# Altium footprint library Components.PcbLib: 41 footprints (part 1 of 3)
Each footprint in its own frame and in the unit in brackets; x right, y up, seen from the top. Pads: shape width x height; smd on the part's side, far side on the other; paste and mask are expansions set on the pad; w line width, h text height; cw(c..) or ccw(c..) is an arc to the next point about the centre after c.
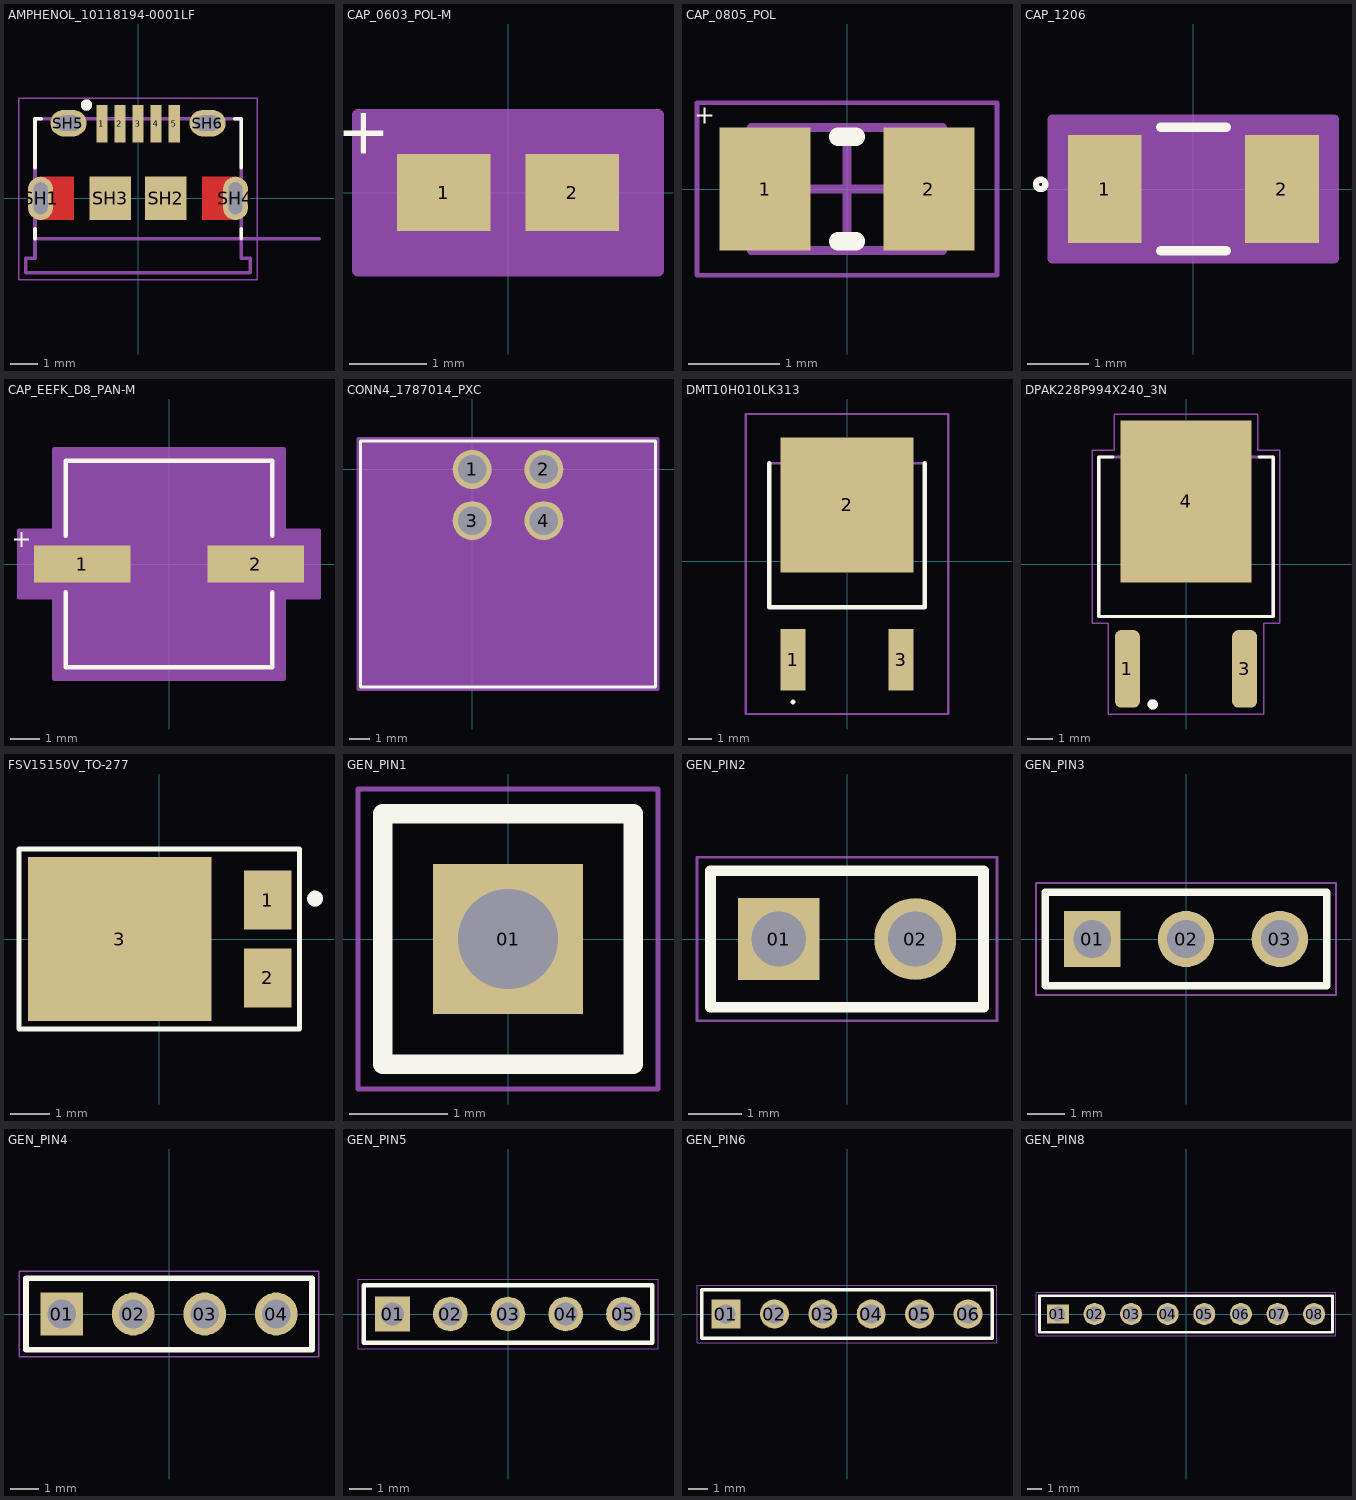
[diagram p0: the footprints below, top view; thin cyan lines are the x and y axes]

## AMPHENOL_10118194-0001LF [mm]
height 2.66
pads (11):
  rect 0.4x1.35 smd: 1(-1.3,2.675) 2(-0.65,2.675) 3(0,2.675) 4(0.65,2.675) 5(1.3,2.675)
  oval 0.9x1.55 hole 0.5 slot 1.15 at 90 deg mask+0: SH1(-3.5,0) SH4(3.5,0)
  rect 1.5x1.55 smd: SH2(1,0) SH3(-1,0)
  oval 1.3x0.95 hole 0.55 slot 0.9 at 0 deg: SH5(-2.5,2.7) SH6(2.5,2.7)
Top Layer:
  region: -2.3,-0.775 -3.445,-0.775 -3.471,-0.774 -3.497,-0.772 -3.523,-0.769 -3.549,-0.764 -3.574,-0.758 -3.6,-0.751 -3.624,-0.742 -3.648,-0.732 -3.672,-0.721 -3.695,-0.708 -3.717,-0.694 -3.739,-0.68 -3.76,-0.664 -3.78,-0.647 -3.799,-0.629 -3.817,-0.61 -3.834,-0.59 -3.85,-0.569 -3.864,-0.547 -3.878,-0.525 -3.891,-0.502 -3.902,-0.478 -3.912,-0.454 -3.921,-0.43 -3.928,-0.404 -3.934,-0.379 -3.939,-0.353 -3.942,-0.327 -3.944,-0.301 -3.945,-0.275 -3.945,0.275 -3.944,0.301 -3.942,0.327 -3.939,0.353 -3.934,0.379 -3.928,0.404 -3.921,0.43 -3.912,0.454 -3.902,0.478 -3.891,0.502 -3.878,0.525 -3.864,0.547 -3.85,0.569 -3.834,0.59 -3.817,0.61 -3.799,0.629 -3.78,0.647 -3.76,0.664 -3.739,0.68 -3.717,0.694 -3.695,0.708 -3.672,0.721 -3.648,0.732 -3.624,0.742 -3.6,0.751 -3.574,0.758 -3.549,0.764 -3.523,0.769 -3.497,0.772 -3.471,0.774 -3.445,0.775 -2.3,0.775
  region: 3.471,0.774 3.497,0.772 3.523,0.769 3.549,0.764 3.574,0.758 3.6,0.751 3.624,0.742 3.648,0.732 3.672,0.721 3.695,0.708 3.717,0.694 3.739,0.68 3.76,0.664 3.78,0.647 3.799,0.629 3.817,0.61 3.834,0.59 3.85,0.569 3.864,0.547 3.878,0.525 3.891,0.502 3.902,0.478 3.912,0.454 3.921,0.43 3.928,0.404 3.934,0.379 3.939,0.353 3.942,0.327 3.944,0.301 3.945,0.275 3.945,-0.275 3.944,-0.301 3.942,-0.327 3.939,-0.353 3.934,-0.379 3.928,-0.404 3.921,-0.43 3.912,-0.454 3.902,-0.478 3.891,-0.502 3.878,-0.525 3.864,-0.547 3.85,-0.569 3.834,-0.59 3.817,-0.61 3.799,-0.629 3.78,-0.647 3.76,-0.664 3.739,-0.68 3.717,-0.694 3.695,-0.708 3.672,-0.721 3.648,-0.732 3.624,-0.742 3.6,-0.751 3.574,-0.758 3.549,-0.764 3.523,-0.769 3.497,-0.772 3.471,-0.774 3.445,-0.775 2.3,-0.775 2.3,0.775 3.445,0.775
Top Overlay:
  circle w0.2: c-1.85,3.35 r0.1
  lines w0.127: -3.7,-1.45 -3.7,-1.1 ; -3.7,1.1 -3.7,2.85 -3.47,2.85 ; 3.47,2.85 3.7,2.85 3.7,1.1 ; 3.7,-1.45 3.7,-1.1
Top Paste:
  region: -2.3,-0.775 -3.445,-0.775 -3.471,-0.774 -3.497,-0.772 -3.523,-0.769 -3.549,-0.764 -3.574,-0.758 -3.6,-0.751 -3.624,-0.742 -3.648,-0.732 -3.672,-0.721 -3.695,-0.708 -3.717,-0.694 -3.739,-0.68 -3.76,-0.664 -3.78,-0.647 -3.799,-0.629 -3.817,-0.61 -3.834,-0.59 -3.85,-0.569 -3.864,-0.547 -3.878,-0.525 -3.891,-0.502 -3.902,-0.478 -3.912,-0.454 -3.921,-0.43 -3.928,-0.404 -3.934,-0.379 -3.939,-0.353 -3.942,-0.327 -3.944,-0.301 -3.945,-0.275 -3.945,0.275 -3.944,0.301 -3.942,0.327 -3.939,0.353 -3.934,0.379 -3.928,0.404 -3.921,0.43 -3.912,0.454 -3.902,0.478 -3.891,0.502 -3.878,0.525 -3.864,0.547 -3.85,0.569 -3.834,0.59 -3.817,0.61 -3.799,0.629 -3.78,0.647 -3.76,0.664 -3.739,0.68 -3.717,0.694 -3.695,0.708 -3.672,0.721 -3.648,0.732 -3.624,0.742 -3.6,0.751 -3.574,0.758 -3.549,0.764 -3.523,0.769 -3.497,0.772 -3.471,0.774 -3.445,0.775 -2.3,0.775
  region: 3.471,0.774 3.497,0.772 3.523,0.769 3.549,0.764 3.574,0.758 3.6,0.751 3.624,0.742 3.648,0.732 3.672,0.721 3.695,0.708 3.717,0.694 3.739,0.68 3.76,0.664 3.78,0.647 3.799,0.629 3.817,0.61 3.834,0.59 3.85,0.569 3.864,0.547 3.878,0.525 3.891,0.502 3.902,0.478 3.912,0.454 3.921,0.43 3.928,0.404 3.934,0.379 3.939,0.353 3.942,0.327 3.944,0.301 3.945,0.275 3.945,-0.275 3.944,-0.301 3.942,-0.327 3.939,-0.353 3.934,-0.379 3.928,-0.404 3.921,-0.43 3.912,-0.454 3.902,-0.478 3.891,-0.502 3.878,-0.525 3.864,-0.547 3.85,-0.569 3.834,-0.59 3.817,-0.61 3.799,-0.629 3.78,-0.647 3.76,-0.664 3.739,-0.68 3.717,-0.694 3.695,-0.708 3.672,-0.721 3.648,-0.732 3.624,-0.742 3.6,-0.751 3.574,-0.758 3.549,-0.764 3.523,-0.769 3.497,-0.772 3.471,-0.774 3.445,-0.775 2.3,-0.775 2.3,0.775 3.445,0.775
Top Solder:
  region: -2.2,-0.875 -3.445,-0.875 -3.476,-0.874 -3.508,-0.872 -3.539,-0.868 -3.57,-0.862 -3.6,-0.855 -3.63,-0.846 -3.66,-0.835 -3.689,-0.823 -3.717,-0.81 -3.745,-0.795 -3.772,-0.778 -3.798,-0.76 -3.823,-0.741 -3.846,-0.721 -3.869,-0.699 -3.891,-0.676 -3.911,-0.653 -3.93,-0.628 -3.948,-0.602 -3.965,-0.575 -3.98,-0.547 -3.993,-0.519 -4.005,-0.49 -4.016,-0.46 -4.025,-0.43 -4.032,-0.4 -4.038,-0.369 -4.042,-0.338 -4.044,-0.306 -4.045,-0.275 -4.045,0.275 -4.044,0.306 -4.042,0.338 -4.038,0.369 -4.032,0.4 -4.025,0.43 -4.016,0.46 -4.005,0.49 -3.993,0.519 -3.98,0.547 -3.965,0.575 -3.948,0.602 -3.93,0.628 -3.911,0.653 -3.891,0.676 -3.869,0.699 -3.846,0.721 -3.823,0.741 -3.798,0.76 -3.772,0.778 -3.745,0.795 -3.717,0.81 -3.689,0.823 -3.66,0.835 -3.63,0.846 -3.6,0.855 -3.57,0.862 -3.539,0.868 -3.508,0.872 -3.476,0.874 -3.445,0.875 -2.2,0.875
  region: 3.476,0.874 3.508,0.872 3.539,0.868 3.57,0.862 3.6,0.855 3.63,0.846 3.66,0.835 3.689,0.823 3.717,0.81 3.745,0.795 3.772,0.778 3.798,0.76 3.823,0.741 3.846,0.721 3.869,0.699 3.891,0.676 3.911,0.653 3.93,0.628 3.948,0.602 3.965,0.575 3.98,0.547 3.993,0.519 4.005,0.49 4.016,0.46 4.025,0.43 4.032,0.4 4.038,0.369 4.042,0.338 4.044,0.306 4.045,0.275 4.045,-0.275 4.044,-0.306 4.042,-0.338 4.038,-0.369 4.032,-0.4 4.025,-0.43 4.016,-0.46 4.005,-0.49 3.993,-0.519 3.98,-0.547 3.965,-0.575 3.948,-0.602 3.93,-0.628 3.911,-0.653 3.891,-0.676 3.869,-0.699 3.846,-0.721 3.823,-0.741 3.798,-0.76 3.772,-0.778 3.745,-0.795 3.717,-0.81 3.689,-0.823 3.66,-0.835 3.63,-0.846 3.6,-0.855 3.57,-0.862 3.539,-0.868 3.508,-0.872 3.476,-0.874 3.445,-0.875 2.2,-0.875 2.2,0.875 3.445,0.875
Bottom Solder:
  drawing of 2 lines, arcs and shapes, not listed
Mechanical 13:
  circle w0.2: c-1.85,3.35 r0.1
  lines w0.127: 6.5,-1.45 -3.7,-1.45 ; -3.7,-1.45 -3.7,-2.15 -4.025,-2.15 -4.025,-2.68 4.025,-2.68 4.025,-2.15 3.7,-2.15 3.7,2.85 -3.7,2.85 -3.7,-1.45
  text "PCB EDGE" at 4.25,-1.25 h0.81
Mechanical 15:
  lines w0.05: -4.275,-2.93 -4.275,3.6 4.275,3.6 4.275,-2.93 -4.275,-2.93
3D body "step_temp.STEP": height 2.67, standoff -0.6, extent -4.025,-2.68 4.025,2.85

## CAP_0603_POL-M [mm]
pads (2):
  rect 1.209x1.001 smd paste+0 mask+0: 1(-0.829,0) 2(0.829,0)
Top Overlay:
  text "+" at -1.525,0.5 h0.6
Mechanical 13:
  lines w0.025: -0.875,-0.475 -0.875,0.475 ; -0.875,-0.475 -0.375,-0.475 -0.375,0.475 -0.875,0.475 ; -0.875,-0.475 0.875,-0.475 ; -0.875,-0.475 -0.875,0.475 ; -0.875,0.475 0.875,0.475 ; 0.875,-0.475 0.375,-0.475 0.375,0.475 0.875,0.475 ; 0.875,-0.475 0.875,0.475 ; 0.875,-0.475 0.875,0.475
Mechanical 15:
  region: 1.942,-1.008 -1.942,-1.008 -1.942,1.008 1.942,1.008
  lines w0.152: -1.942,-1.008 -1.942,1.008 1.942,1.008 1.942,-1.008 -1.942,-1.008
3D body "CAPC17595_87N_KEM.step": height 0.87, standoff 0, extent -0.875,-0.475 0.875,0.475

## CAP_0805_POL [mm] "Chip Resistor, 2-Leads, Body 2.00x1.25mm, IPC Medium Density"
height 0.6
pads (2):
  rect 1x1.35 smd: 1(-0.9,0) 2(0.9,0)
Top Overlay:
  lines w0.2: -0.1,-0.575 0.1,-0.575 ; -0.1,0.575 0.1,0.575
  text "+" at -1.45,0.717 h0.2
Top Courtyard:
  lines w0.05: -1.65,-0.95 1.65,-0.95 1.65,0.95 -1.65,0.95 -1.65,-0.95
  lines w0.1: -0.5,0 0.5,0 ; 0,-0.5 0,0.5
Top Assembly:
  lines w0.1: -1.05,-0.675 1.05,-0.675 1.05,0.675 -1.05,0.675 -1.05,-0.675
3D body: height 0.6, standoff 0, extent 0.7,-0.675 1.05,0.675
3D body: height 0.6, standoff 0, extent -1.05,-0.675 -0.7,0.675
3D body: height 0.6, standoff 0, extent -0.7,-0.675 0.7,0.675

## CAP_1206 [mil]
pads (2):
  rect 47x69 smd paste+0 mask+0: 1(-56.5,0) 2(56.5,0)
Top Overlay:
  circle w3.94: c-97.44,2.95 r3
  lines w6: -20.89,-39.5 20.89,-39.5 ; -20.89,39.5 20.89,39.5
Mechanical 13:
  circle w0: c-51.5,0 r3
  lines w1: -66,-34.5 -66,34.5 ; -66,-34.5 -33,-34.5 -33,34.5 -66,34.5 ; -66,-34.5 66,-34.5 ; -66,-34.5 -66,34.5 ; -66,34.5 66,34.5 ; 66,-34.5 33,-34.5 33,34.5 66,34.5 ; 66,-34.5 66,34.5 ; 66,-34.5 66,34.5
Mechanical 15:
  region: 90,-44.5 -90,-44.5 -90,44.5 90,44.5
  lines w6: -90,-44.5 -90,44.5 90,44.5 90,-44.5 -90,-44.5
3D body "CAP_UMK316AB7475KL-T_TAY.step": height 70.98, standoff 0, extent -65.98,-34.49 65.98,34.49

## CAP_EEFK_D8_PAN-M [mil]
pads (2):
  rect 130x50 smd paste+0 mask+0: 1(-116.5,0) 2(116.5,0)
Top Overlay:
  lines w6: -139,-38.1 -139,-139 139,-139 139,-38.1 ; -139,38.1 -139,139 139,139 139,38.1
  text "+" at -184.06,22.64 h23.62
Mechanical 13:
  lines w1: -134,-67 -67,-134 ; -134,67 -67,134 ; -134,-134 -134,134 134,134 134,-134 -134,-134
Mechanical 15:
  region: -154,-45 -201.5,-45 -201.5,45 -154,45 -154,154 154,154 154,45 201.5,45 201.5,-45 154,-45 154,-154 -154,-154
  lines w6: -201.5,-45 -154,-45 -154,-154 154,-154 154,-45 201.5,-45 201.5,45 154,45 154,154 -154,154 -154,45 -201.5,45 -201.5,-45
3D body "CAP_EEFK_D8_PAN.step": height 317.09, standoff 0, extent -153.5,-134.02 153.5,134.02

## CONN4_1787014_PXC [mm]
pads (4):
  round 1.905 / inner round 1.524 / far side round 1.905 hole 1.397 paste-2539.97 mask+0: 1(0,0) 2(3.5,0) 3(0,-2.5) 4(3.5,-2.5)
Top Overlay:
  lines w0.152: -5.451,-10.627 8.951,-10.627 8.951,1.387 -5.451,1.387 -5.451,-10.627
Mechanical 13:
  lines w0.025: -5.324,-10.5 8.824,-10.5 8.824,1.26 -5.324,1.26 -5.324,-10.5
Mechanical 15:
  region: 9.078,1.514 -5.578,1.514 -5.578,-10.754 9.078,-10.754
  lines w0.152: -5.578,-10.754 -5.578,1.514 9.078,1.514 9.078,-10.754 -5.578,-10.754
3D body "1787014.step": height 10.8, standoff -2, extent -5.25,-10.5 8.75,1.1

## DMT10H010LK313 [mm]
pads (3):
  rect 1.06x2.6 smd: 1(-2.286,-4.16) 3(2.286,-4.16)
  rect 5.632x5.7 smd: 2(0,2.39)
Top Overlay:
  lines w0.1: -2.286,-6 ccw(c-2.286,-5.95) -2.286,-5.9 ccw(c-2.286,-5.95) -2.286,-6
  lines w0.2: -3.29,4.16 -3.29,-1.94 3.29,-1.94 3.29,4.16
Mechanical 15:
  lines w0.1: -3.29,-1.94 3.29,-1.94 3.29,4.16 -3.29,4.16 -3.29,-1.94
Bottom Assembly:
  lines w0.1: -4.29,-6.46 4.29,-6.46 4.29,6.24 -4.29,6.24 -4.29,-6.46
3D body "DMT10H010LK3-13.stp": height 2.29, standoff -0.09, extent -3.29,-4.946 3.291,4.975

## DPAK228P994X240_3N [mm]
pads (3):
  rrect50% 0.97x3.02 smd: 1(-2.286,-4.09) 3(2.286,-4.09)
  rect 5.09x6.32 smd paste-4: 4(0,2.44)
Top Overlay:
  circle w0.2: c-1.3,-5.475 r0.1
  lines w0.127: -2.846,4.176 -3.4,4.176 -3.4,-2.044 3.4,-2.044 3.4,4.176 2.846,4.176
Top Paste:
  region: -0.41,-0.45 -2.13,-0.45 -2.13,1.11 -0.41,1.11
  region: 2.13,-0.45 0.41,-0.45 0.41,1.11 2.13,1.11
  region: -0.41,3.77 -2.13,3.77 -2.13,5.33 -0.41,5.33
  region: 2.13,3.77 0.41,3.77 0.41,5.33 2.13,5.33
  region: -0.41,1.66 -2.13,1.66 -2.13,3.22 -0.41,3.22
  region: 2.13,1.66 0.41,1.66 0.41,3.22 2.13,3.22
Mechanical 13:
  circle w0.2: c-1.3,-5.475 r0.1
  lines w0.127: -3.4,-2.044 -3.4,4.176 3.4,4.176 3.4,-2.044 -3.4,-2.044
Mechanical 15:
  lines w0.05: -3.65,-2.32 -3.65,4.43 -2.8,4.43 -2.8,5.85 2.8,5.85 2.8,4.43 3.65,4.43 3.65,-2.32 3.03,-2.32 3.03,-5.85 -3.03,-5.85 -3.03,-2.32 -3.65,-2.32
3D body "AOD417--3DModel-STEP-56544.STEP": height 2.41, standoff -0.19, extent -3.302,-4.969 3.302,5.064

## FSV15150V_TO-277 [mm]
pads (3):
  rect 1.2x1.5 smd: 1(2.75,0.985) 2(2.75,-0.985)
  rect 4.65x4.15 smd: 3(-1,0)
Top Overlay:
  circle w0.2: c3.95,1.025 r0.1
  lines w0.127: -3.556,-2.286 -3.556,2.286 3.556,2.286 3.556,-2.286 -3.556,-2.286
Mechanical 13:
  circle w0.2: c3.95,1.025 r0.1
3D body "step_temp.STEP": height 1.2, standoff 0, extent -3.25,-2.22 3.25,2.22

## GEN_PIN1 [mil] "Generic 40 mils drill size, 100 mils step"
pads (1):
  rect 60x60 / inner round 60 / far side rect 60x60 hole 40: 01(0,0)
Top Overlay:
  lines w7.87: -50,-50 50,-50 50,50 -50,50 -50,-50
Mechanical 13:
  lines w3.94: -50,-50 -50,50 ; -50,-50 50,-50 ; -50,-50 -50,50 ; -50,50 50,50 ; -50,50 50,50 ; 50,-50 50,50 ; 50,-50 50,50
Mechanical 15:
  lines w1.97: -59.84,-59.84 59.84,-59.84 59.84,59.84 -59.84,59.84 -59.84,-59.84
3D body "Download_STP_61300111121+(rev1).stp": height 337.4, standoff -116.93, extent -50,-50 50,50

## GEN_PIN2 [mil] "Generic 40 mils drill size, 100 mils step"
pads (2):
  rect 60x60 / inner round 60 / far side rect 60x60 hole 40: 01(-50,0)
  round 60 hole 40: 02(50,0)
Top Overlay:
  lines w7.87: -100,-50 -100,50 100,50 100,-50 -100,-50
Mechanical 13:
  lines w3.94: -100,-50 -100,50 ; -100,-50 100,-50 ; -100,-50 -100,50 ; -100,50 100,50 ; -100,50 100,50 ; 100,-50 100,50 ; 100,-50 100,50
Mechanical 15:
  lines w1.97: -109.84,-59.84 -109.84,59.84 109.84,59.84 109.84,-59.84 -109.84,-59.84
3D body "Download_STP_61300211121+(rev1).stp": height 337.4, standoff -116.93, extent -100,-50 100,50

## GEN_PIN3 [mil] "Generic 40 mils drill size, 100 mils step"
pads (3):
  rect 60x60 / inner round 60 / far side rect 60x60 hole 40: 01(-100,0)
  round 60 hole 40: 02(0,0) 03(100,0)
Top Overlay:
  lines w7.87: -150,-50 150,-50 150,50 -150,50 -150,-50
Mechanical 13:
  lines w3.94: -150,-50 -150,50 ; -150,-50 150,-50 ; -150,-50 -150,50 ; -150,50 150,50 ; -150,50 150,50 ; 150,-50 150,50 ; 150,-50 150,50
Mechanical 15:
  lines w1.97: -159.84,-59.84 159.84,-59.84 159.84,59.84 -159.84,59.84 -159.84,-59.84
3D body "Download_STP_61300311121+(rev1).stp": height 337.4, standoff -116.93, extent -150,-50 150,50

## GEN_PIN4 [mil] "Generic 40 mils drill size, 100 mils step"
pads (4):
  rect 60x60 hole 40: 01(-150,0)
  round 60 hole 40: 02(-50,0) 03(50,0) 04(150,0)
Top Overlay:
  lines w7.87: -200,-50 200,-50 200,50 -200,50 -200,-50
Mechanical 13:
  lines w3.94: -200,-50 -200,50 ; -200,-50 200,-50 ; -200,-50 -200,50 ; -200,50 200,50 ; -200,50 200,50 ; 200,-50 200,50 ; 200,-50 200,50
Mechanical 15:
  lines w1.97: -209.84,-59.84 209.84,-59.84 209.84,59.84 -209.84,59.84 -209.84,-59.84
3D body "Download_STP_61300411121+(rev1).stp": height 337.4, standoff -116.93, extent -200,-50 200,50

## GEN_PIN5 [mil] "Generic 40 mils drill size, 100 mils step"
pads (5):
  rect 60x60 hole 40: 01(-200,0)
  round 60 hole 40: 02(-100,0) 03(0,0) 04(100,0) 05(200,0)
Top Overlay:
  lines w7.87: -250,-50 250,-50 250,50 -250,50 -250,-50
Mechanical 13:
  lines w3.94: -250,-50 -250,50 ; -250,-50 250,-50 ; -250,-50 -250,50 ; -250,50 250,50 ; -250,50 250,50 ; 250,-50 250,50 ; 250,-50 250,50
Mechanical 15:
  lines w1.97: -259.84,-59.84 259.84,-59.84 259.84,59.84 -259.84,59.84 -259.84,-59.84
3D body "Download_STP_61300511121+(rev1).stp": height 337.4, standoff -116.93, extent -250,-50 250,50

## GEN_PIN6 [mil] "Generic 40 mils drill size, 100 mils step"
pads (6):
  rect 60x60 / inner round 60 / far side rect 60x60 hole 40: 01(-250,0)
  round 60 hole 40: 02(-150,0) 03(-50,0) 04(50,0) 05(150,0) 06(250,0)
Top Overlay:
  lines w7.87: -300,-50 -300,50 300,50 300,-50 -300,-50
Mechanical 13:
  lines w3.94: -300,-50 -300,50 ; -300,-50 300,-50 ; -300,-50 -300,50 ; -300,50 300,50 ; -300,50 300,50 ; 300,-50 300,50 ; 300,-50 300,50
Mechanical 15:
  lines w1.97: -309.84,-59.84 -309.84,59.84 309.84,59.84 309.84,-59.84 -309.84,-59.84
3D body "Download_STP_61300611121+(rev1).stp": height 337.4, standoff -116.93, extent -300,-50 300,50

## GEN_PIN8 [mil] "Generic 40 mils drill size, 100 mils step"
pads (8):
  rect 60x52 / inner oval 60x52 / far side rect 60x52 hole 40: 01(-350,0)
  round 60 hole 40: 02(-250,0) 03(-150,0) 04(-50,0) 05(50,0) 06(150,0) 07(250,0) 08(350,0)
Top Overlay:
  lines w7.87: -400,-50 -400,50 400,50 400,-50 -400,-50
Mechanical 13:
  lines w3.94: -400,-50 400,-50 400,50 -400,50 -400,-50
Mechanical 15:
  lines w1.97: -409.84,-59.84 409.84,-59.84 409.84,59.84 -409.84,59.84 -409.84,-59.84
3D body "61300811121+(rev1).stp": height 337.4, standoff -116.93, extent -400,-50 400,50